# Altium footprint library master.PcbLib: 64 footprints (part 2 of 4)
Each footprint in its own frame and in the unit in brackets; x right, y up, seen from the top. Pads: shape width x height; smd on the part's side, far side on the other; paste and mask are expansions set on the pad; w line width, h text height; cw(c..) or ccw(c..) is an arc to the next point about the centre after c.
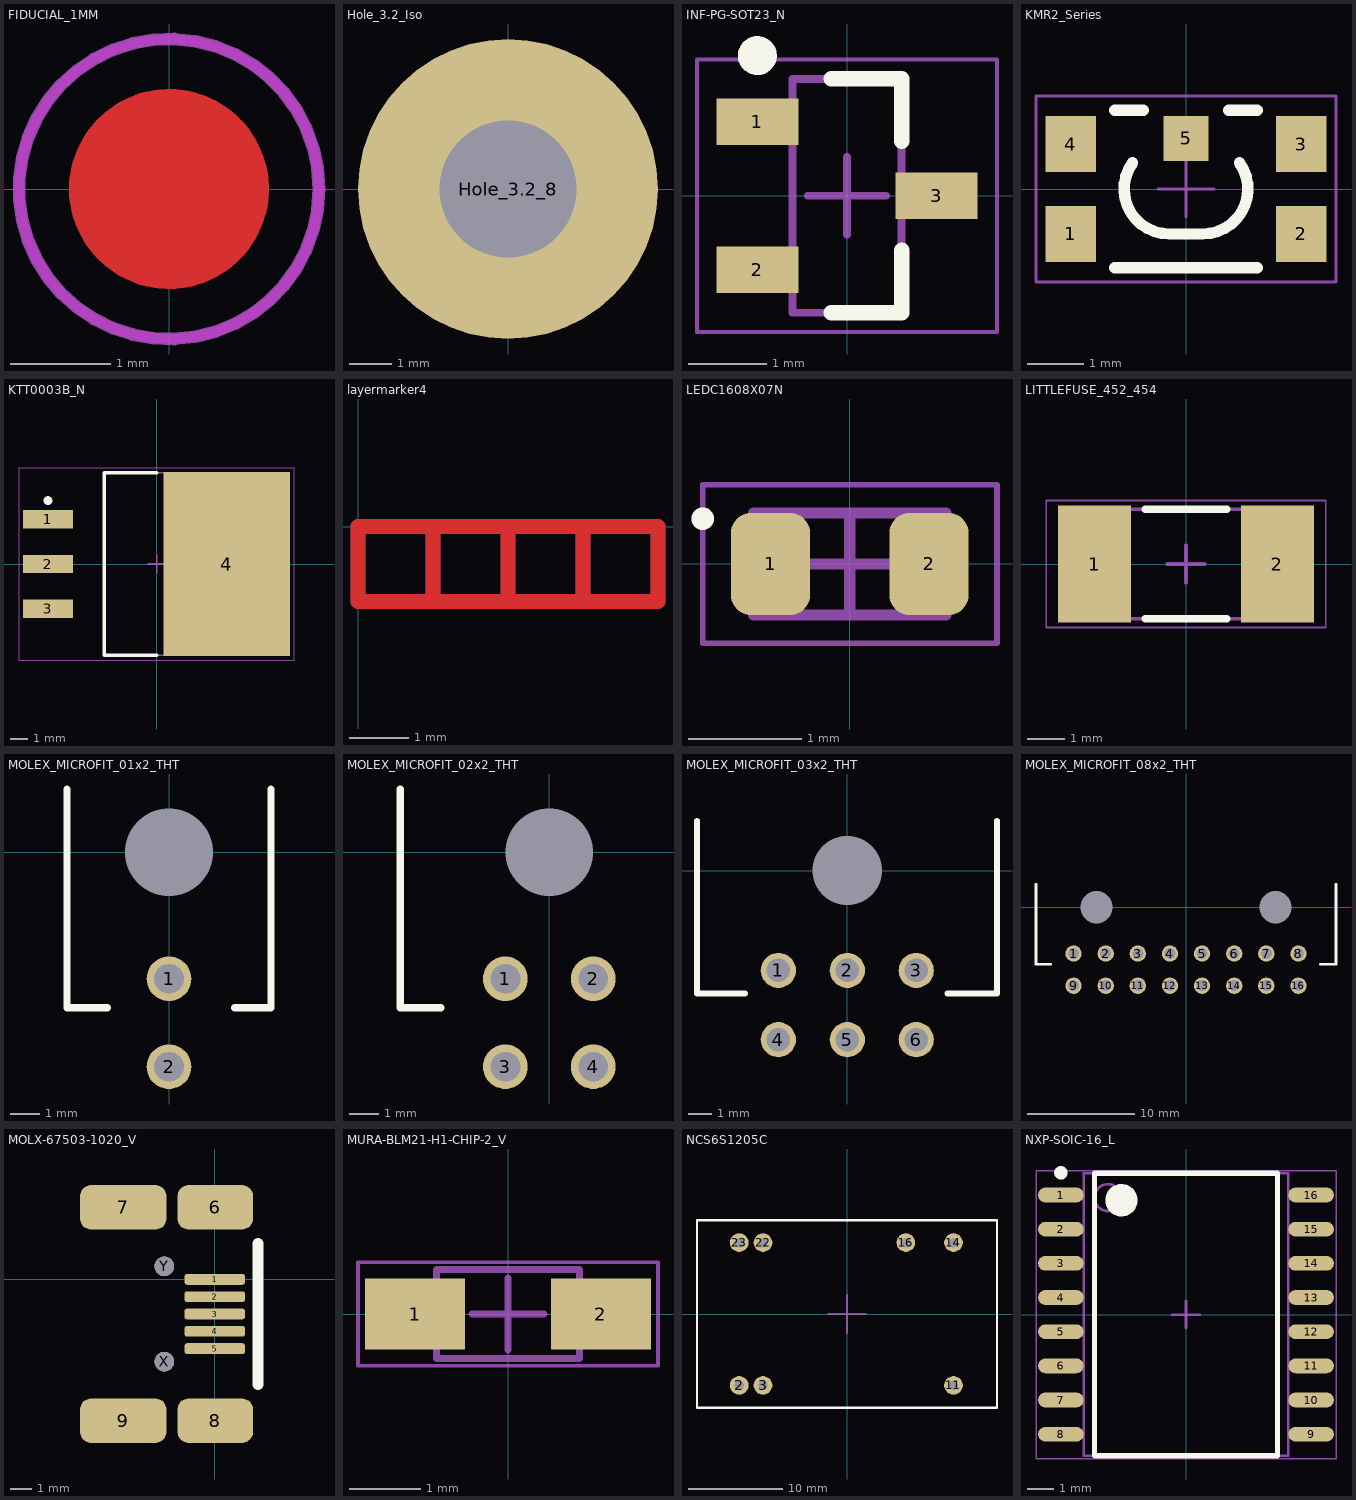
[diagram p1: the footprints below, top view; thin cyan lines are the x and y axes]

## FIDUCIAL_1MM [mm] "FIDUCIAL_1MM"
Top Layer:
  circle w1: c0,0 r0.5
Top Layer keep-out:
  circle w0.1: c0,0 r1.5
Top Solder:
  circle w1.5: c0,0 r0.316
Mechanical 22:
  circle w0.127: c0,0 r1.5

## Hole_3.2_Iso [mm]
height 1.76
pads (1):
  round 7 hole 3.2: Hole_3.2_8(0,0)

## INF-PG-SOT23_N [mm] "SOT23, 3-Leads, Body 2.9x1.3mm, Pitch 0.95mm, IPC Medium Density"
height 1.1
pads (3):
  rect 1.05x0.6 smd: 1(-1.15,0.95) 2(-1.15,-0.95) 3(1.15,0)
Top Overlay:
  circle w0.25: c-1.15,1.8 r0.125
  lines w0.2: -0.2,-1.5 0.7,-1.5 0.7,-0.7 ; -0.2,1.5 0.7,1.5 0.7,0.7
Mechanical 13:
  lines w0.1: -0.7,-1.5 0.7,-1.5 0.7,1.5 -0.7,1.5 -0.7,-1.5
Mechanical 15:
  lines w0.05: -1.925,-1.75 -1.925,1.75 1.925,1.75 1.925,-1.75 -1.925,-1.75
  lines w0.1: -0.5,0 0.5,0 ; 0,-0.5 0,0.5
3D body: height 1.1, standoff 0.1, extent -0.7,-1.5 0.7,1.5

## KMR2_Series [mil] "Microminiature Tact Switch for SMT"
height 74.8
pads (5):
  rect 35.43x39.37 smd: 1(-80.71,-31.5) 2(80.71,-31.5) 3(80.71,31.5) 4(-80.71,31.5)
  rect 31.5x31.5 smd: 5(0,35.43)
Top Overlay:
  lines w7.99: -50,-55 50,-55 ; -50,55 -30,55 ; -37.44,18.31 ccw(c-11.81,0) -11.81,-31.5 11.81,-31.5 ccw(c11.81,0) 37.44,18.31 ; 30,55 50,55
Mechanical 15:
  lines w2.01: -19.69,0 19.68,0 ; 0,-19.68 0,19.69 ; -105,-65 -105,65 105,65 105,-65 -105,-65
3D body "KMR211GLFS.stp": height 75.59, standoff -0.77, extent -90.55,-55.12 90.55,55.12

## KTT0003B_N [mm] "D2-PAK, 3-Leads, Body 10.41x8.89mm, Pitch 2.54mm, IPC Medium Density"
height 4.64
pads (4):
  rect 2.85x1.05 smd: 1(-6.2,2.54) 2(-6.2,0) 3(-6.2,-2.54)
  rect 7.2x10.5 smd: 4(4,0)
Top Overlay:
  circle w0.25: c-6.2,3.615 r0.125
  lines w0.2: 0,-5.2 -3,-5.2 -3,5.2 0,5.2
Mechanical 1:
  text ".Designator" at -1.651,-0.508 h1.2
Mechanical 13:
  lines w0.1: -3,-5.2 -3,5.2 5.89,5.2 5.89,-5.2 -3,-5.2
Mechanical 15:
  lines w0.05: -7.85,-5.5 7.85,-5.5 7.85,5.5 -7.85,5.5 -7.85,-5.5
  lines w0.1: -0.5,0 0.5,0 ; 0,-0.5 0,0.5
3D body "KTT0003B_N.step": height 4.64, standoff 0, extent -6.775,-5.2 7.575,5.2

## layermarker4 [mm] "Marker for a 4 layerstack"
Top Layer:
  lines w0.254: 1.27,-1.27 1.27,0 ; 1.27,-1.27 0,-1.27 0,0 1.27,0 ; 1.27,-1.27 2.54,-1.27 ; 1.27,0 2.54,0 ; 2.54,-1.27 2.54,0 ; 2.54,-1.27 3.81,-1.27 ; 2.54,0 3.81,0 ; 3.81,-1.27 3.81,0 ; 3.81,-1.27 5.08,-1.27 5.08,0 3.81,0
  text "1" at 0.559,-0.864 h0.51
Mid-Layer 1:
  lines w0.254: 1.27,-1.27 2.54,-1.27 ; 1.27,-1.27 0,-1.27 0,0 1.27,0 ; 1.27,-1.27 1.27,0 ; 1.27,0 2.54,0 ; 2.54,-1.27 2.54,0 ; 2.54,-1.27 3.81,-1.27 ; 2.54,0 3.81,0 ; 3.81,-1.27 5.08,-1.27 5.08,0 3.81,0 ; 3.81,-1.27 3.81,0
  text "2" at 1.727,-0.864 h0.51
Mid-Layer 2:
  lines w0.254: 1.27,-1.27 0,-1.27 0,0 1.27,0 ; 1.27,-1.27 2.54,-1.27 ; 1.27,-1.27 1.27,0 ; 1.27,0 2.54,0 ; 2.54,-1.27 2.54,0 ; 2.54,-1.27 3.81,-1.27 ; 2.54,0 3.81,0 ; 3.81,-1.27 5.08,-1.27 5.08,0 3.81,0 ; 3.81,-1.27 3.81,0
  text "3" at 2.997,-0.864 h0.51
Bottom Layer:
  lines w0.254: 1.27,-1.27 0,-1.27 0,0 1.27,0 ; 1.27,-1.27 2.54,-1.27 ; 1.27,-1.27 1.27,0 ; 1.27,0 2.54,0 ; 2.54,-1.27 2.54,0 ; 2.54,-1.27 3.81,-1.27 ; 2.54,0 3.81,0 ; 3.81,-1.27 5.08,-1.27 5.08,0 3.81,0 ; 3.81,-1.27 3.81,0
  text "4" at 4.597,-0.864 h0.51

## LEDC1608X07N [mm] "LED, 2-Leads, Body 1,60x0,80mm, IPC Medium Density"
height 0.7
pads (2):
  rrect50% 0.7x0.9 smd: 1(-0.7,0) 2(0.7,0)
Top Overlay:
  circle w0.1: c-1.3,0.4 r0.05
Mechanical 13:
  lines w0.1: -0.85,-0.45 -0.85,0.45 0.85,0.45 0.85,-0.45 -0.85,-0.45
Mechanical 15:
  lines w0.05: -1.3,-0.7 -1.3,0.7 1.3,0.7 1.3,-0.7 -1.3,-0.7
  lines w0.1: -0.45,0 0.45,0 ; 0,-0.45 0,0.45
3D body "STEP-WL-SMCW-0603-rev1.stp": height 0.7, standoff 0, extent -0.8,-0.4 0.8,0.4

## LITTLEFUSE_452_454 [mm] "Littlefuse 452/454 Series Fuse, 2-Leads, Body 6,10x2,69mm, IPC Medium Density"
height 2.94
pads (2):
  rect 1.96x3.15 smd: 1(-2.45,0) 2(2.45,0)
Top Overlay:
  lines w0.2: -1.1,-1.475 1.1,-1.475 ; -1.1,1.475 1.1,1.475
Mechanical 13:
  lines w0.1: -3.15,-1.47 -3.15,1.47 3.15,1.47 3.15,-1.47 -3.15,-1.47
Mechanical 15:
  lines w0.05: -3.75,-1.7 3.75,-1.7 3.75,1.7 -3.75,1.7 -3.75,-1.7
  lines w0.1: -0.5,0 0.5,0 ; 0,-0.5 0,0.5
3D body "LITTLEFUSE_452_454.step": height 2.94, standoff 0, extent -3.15,-1.47 3.15,1.47

## MOLEX_MICROFIT_01x2_THT [mil] "Micro-Fit 3.0 Right Angle Header, 3.00mm Pitch, Dual Row, 2 Circuits, with Snap-in Plastic Peg PCB Lock, Tin, Glow Wire Capable, Black, 43045-0200"
height 345
pads (3):
  round 60 hole 40: 1(0,-170) 2(0,-287.99)
  round 39.37 hole 117.99 unplated paste+0 mask+4: ""(0,0)
Top Overlay:
  lines w10: -137,85 -137,-209.02 -83,-209.02 ; 88,-209.02 137,-209.02 137,85
3D body "430450200.stp": height 345.35, standoff -125.12, extent -140.75,-300.95 140.75,180.94

## MOLEX_MICROFIT_02x2_THT [mil] "Micro-Fit 3.0 Right Angle Header, 3.00mm Pitch, Dual Row, 4 Circuits, with Snap-in Plastic Peg PCB Lock, Tin, Glow Wire Capable, Black, 43045-0400"
height 345
pads (5):
  round 60 hole 40: 1(-59.02,-170) 2(59.02,-170) 3(-59.02,-287.99) 4(59.02,-287.99)
  round 39.37 hole 117.99 unplated paste+0 mask+4: ""(0,0)
Top Overlay:
  lines w10: -200,85 -200,-209.02 -146.02,-209.02
3D body "430450400.stp": height 345.35, standoff -125.12, extent -199.8,-300.95 199.8,180.94

## MOLEX_MICROFIT_03x2_THT [mil] "Micro-Fit 3.0 Right Angle Header, 3.00mm Pitch, Dual Row, 6 Circuits, with Snap-in Plastic Peg PCB Lock, Tin, Glow Wire Capable, Black, 43045-0600"
height 345
pads (7):
  round 60 hole 40: 1(-117.48,-170) 2(0,-170) 3(117.48,-170) 4(-117.48,-287.99) 5(0,-287.99) 6(117.48,-287.99)
  round 39.37 hole 117.99 unplated paste+0 mask+4: ""(0,0)
Top Overlay:
  lines w10: -256,85 -256,-209.02 -174,-209.02 ; 171,-209.02 255,-209.02 255,85
3D body "430450600.stp": height 345.35, standoff -125.12, extent -258.86,-300.95 258.86,180.94

## MOLEX_MICROFIT_08x2_THT [mil] "Micro-Fit 3.0 Right Angle Header, 3.00mm Pitch, Dual Row, 16 Circuits, with Snap-in Plastic Peg PCB Lock, Tin, Glow Wire Capable, Black, 43045-1600"
height 345
pads (18):
  round 60 hole 40: 1(-412.99,-170) 2(-295,-170) 3(-177.01,-170) 4(-59.02,-170) 5(59.02,-170) 6(177.01,-170) 7(295,-170) 8(412.99,-170) 9(-412.99,-287.99) 10(-295,-287.99) 11(-177.01,-287.99) 12(-59.02,-287.99) 13(59.02,-287.99) 14(177.01,-287.99) 15(295,-287.99) 16(412.99,-287.99)
  round 39.37 hole 117.99 unplated paste+0 mask+4: ""(-328.5,0) ""(328.5,0)
Top Overlay:
  lines w10: -551,85 -551,-209.02 -497,-209.02 ; 494,-209.02 551,-209.02 551,85
3D body "430451600.stp": height 345.35, standoff -125.12, extent -554.13,-300.95 554.13,180.94

## MOLX-67503-1020_V [mm] "Mini USB Connector, SMT, Righer Angle"
pads (11):
  rrect50% 2.8x0.5 smd: 1(0,0) 2(0,-0.8) 3(0,-1.6) 4(0,-2.4) 5(0,-3.2)
  rrect50% 3.5x2.05 smd: 6(0.025,3.325) 8(0.025,-6.525)
  rrect50% 4x2.05 smd: 7(-4.225,3.325) 9(-4.225,-6.525)
  round 0.9 hole 0.9 unplated: X(-2.325,-3.8) Y(-2.325,0.6)
Top Overlay:
  lines w0.5: 2,-4.85 2,1.65
3D body "USB Mini B - Connector.stp": height 3.95, standoff -1, extent -8.217,-6.557 0.783,3.343

## MURA-BLM21-H1-CHIP-2_V [mm] "Chip Ferrite Bead, 2-Leads, Body 2x1.25mm, Height 1.05mm"
height 1.05
pads (2):
  rect 1.4x1 smd: 1(-1.3,0) 2(1.3,0)
Mechanical 13:
  lines w0.1: -1,-0.625 -1,0.625 1,0.625 1,-0.625 -1,-0.625
Mechanical 15:
  lines w0.05: -2.1,-0.725 -2.1,0.725 2.1,0.725 2.1,-0.725 -2.1,-0.725
  lines w0.1: -0.5,0 0.5,0 ; 0,-0.5 0,0.5
3D body: height 1.05, standoff 0, extent -1,-0.625 1,0.625

## NCS6S1205C [mm] "Isolated 6W 4:1 Input Single Output DC/DC Converter"
height 10.5
pads (7):
  round 2 hole 1: 2(-11.5,-7.62) 3(-8.96,-7.62) 11(11.36,-7.62) 14(11.36,7.62) 16(6.28,7.62) 22(-8.96,7.62) 23(-11.5,7.62)
Top Overlay:
  lines w0.254: -16,-10 16,-10 16,10 -16,10 -16,-10
Mechanical 15:
  lines w0.254: -2,0 -1.5,0 1.5,0 2,0 ; 0,-2 0,2
3D body "mps_dcdc_ncs6s_a.step": height 10.62, standoff -6.5, extent -16,-10 16,10

## NXP-SOIC-16_L [mm] "SOIC, 16-Leads, Body 10.5x7.6mm, Pitch 1.27mm, IPC High Density"
height 2.65
pads (16):
  oval 1.7x0.55 smd: 1(-4.65,4.445) 2(-4.65,3.175) 3(-4.65,1.905) 4(-4.65,0.635) 5(-4.65,-0.635) 6(-4.65,-1.905) 7(-4.65,-3.175) 8(-4.65,-4.445) 9(4.65,-4.445) 10(4.65,-3.175) 11(4.65,-1.905) 12(4.65,-0.635) 13(4.65,0.635) 14(4.65,1.905) 15(4.65,3.175) 16(4.65,4.445)
Top Overlay:
  circle w0.6: c-2.4,4.25 r0.3
  circle w0.25: c-4.65,5.27 r0.125
  lines w0.2: -3.4,-5.25 3.4,-5.25 3.4,5.25 -3.4,5.25 -3.4,-5.25
Mechanical 13:
  circle w0.1: c-2.9,4.35 r0.5
  lines w0.1: -3.8,-5.25 3.8,-5.25 3.8,5.25 -3.8,5.25 -3.8,-5.25
Mechanical 15:
  lines w0.05: -5.575,-5.35 5.575,-5.35 5.575,5.35 -5.575,5.35 -5.575,-5.35
  lines w0.1: -0.5,0 0.5,0 ; 0,-0.5 0,0.5
3D body "SOIC127P1030X265-16L.step": height 2.65, standoff 0, extent -5.162,-5.25 5.162,5.25